# Altium footprint library STM32H7-Board.PcbLib: 36 footprints (part 1 of 3)
Each footprint in its own frame and in the unit in brackets; x right, y up, seen from the top. Pads: shape width x height; smd on the part's side, far side on the other; paste and mask are expansions set on the pad; w line width, h text height; cw(c..) or ccw(c..) is an arc to the next point about the centre after c.
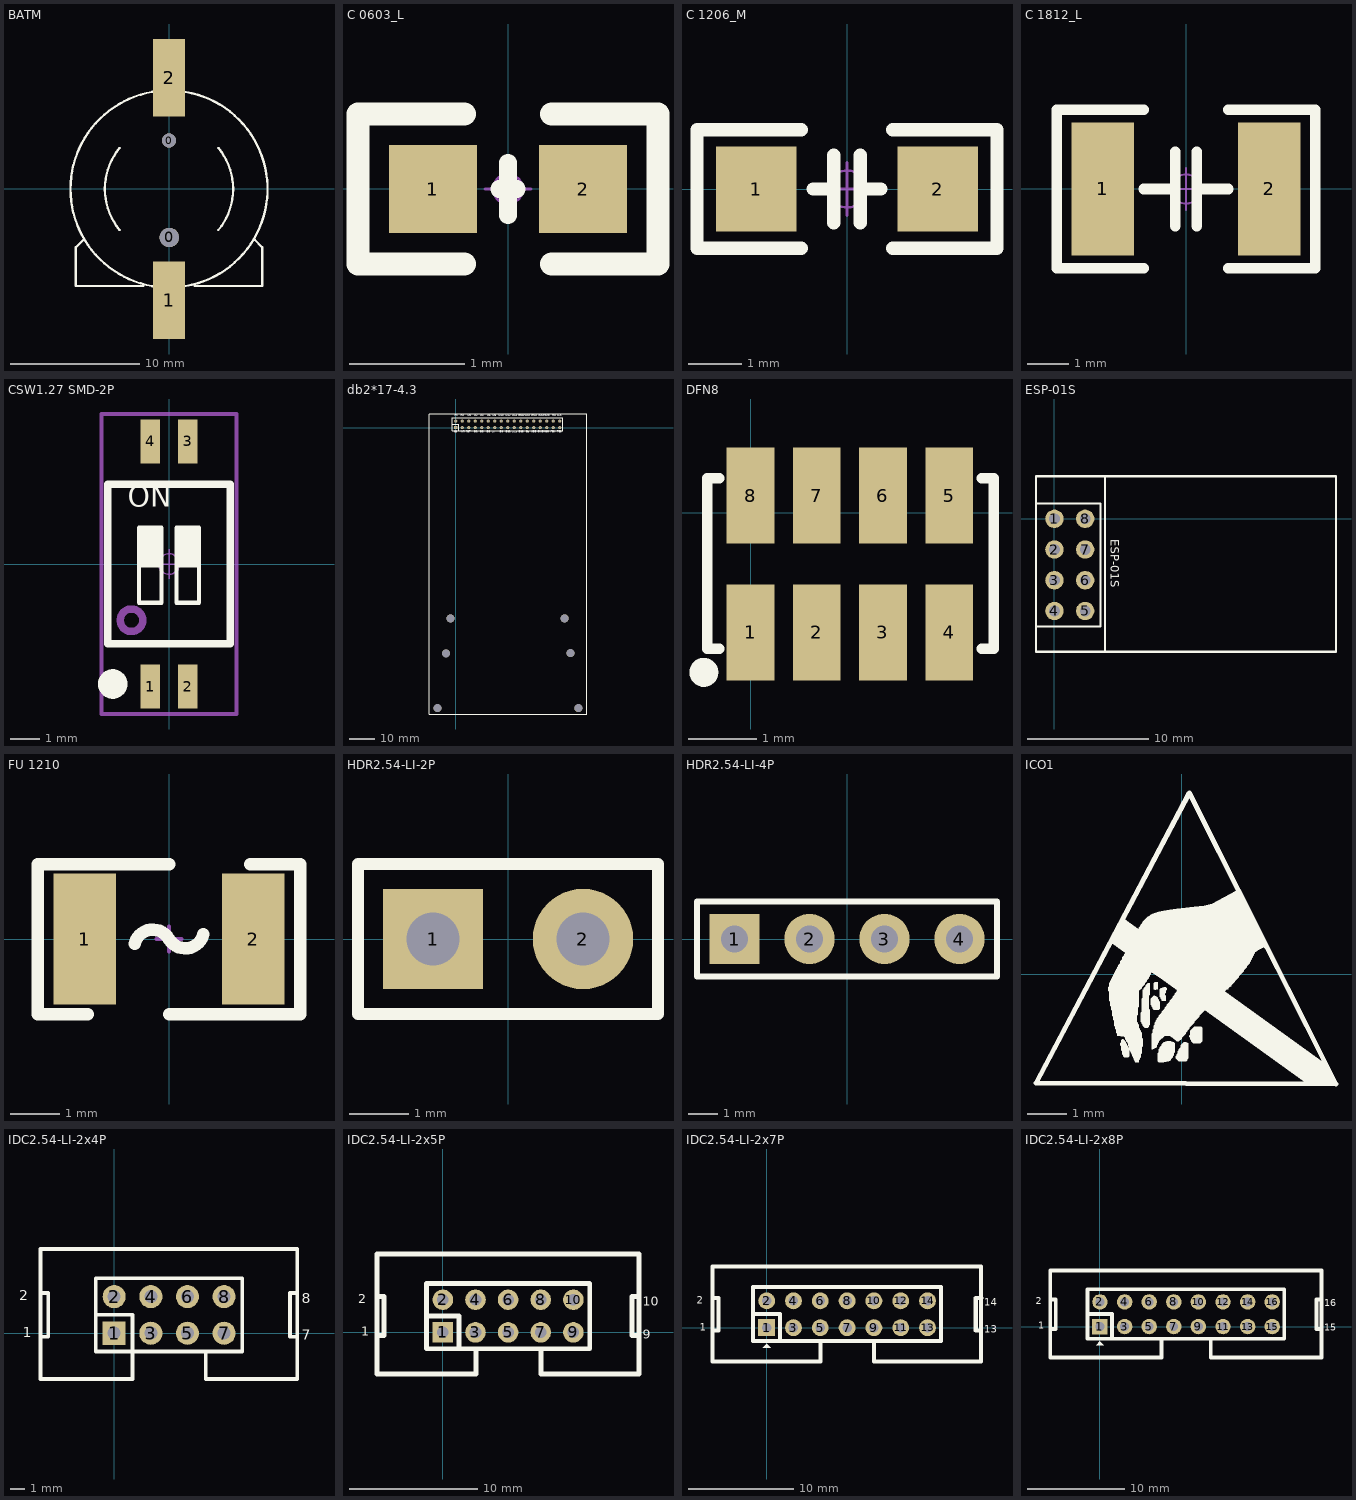
[diagram p0: the footprints below, top view; thin cyan lines are the x and y axes]

## BATM [mm]
height 10.16
pads (4):
  round 1.1 hole 1.1 unplated: 0(0,3.748)
  round 1.5 hole 1.5 unplated: 0(0.025,-3.752)
  rect 2.5x6 smd: 1(0,-8.602) 2(0,8.598)
Top Overlay:
  lines w0.178: -6.6,-3.902 -7.2,-4.502 -7.2,-7.502 -2,-7.502 ; -3.815,-3.171 cw(c0,-0.002) -3.812,3.171 ; -0.833,-7.576 cw(c0,-0.002) -7.62,-0.002 cw(c0,-0.002) -0.833,7.573 ; 0.833,-7.576 ccw(c0,-0.002) 0.833,7.573 ; 2,-7.502 7.2,-7.502 7.2,-4.502 6.625,-3.927 ; 3.81,-3.177 ccw(c0,-0.002) 3.812,3.171

## C 0603_L [mil] "无极性贴片电容"
height 400
pads (2):
  rect 30x30 smd: 1(-25.59,0) 2(25.59,0)
Top Overlay:
  lines w6: -3,0 0,0 3,0 ; 0,-9 0,9
  lines w8: -15,-25.59 -51.18,-25.59 -51.18,25.59 -15,25.59 ; 15,-25.59 51.18,-25.59 51.18,25.59 15,25.59
Mechanical 15:
  circle w1: c0,0 r5
  lines w1: -7.87,0 7.87,0 ; 0,-7.87 0,7.87
3D body "C 0603.STEP": height 31.89, standoff -0.39, extent -31.5,-16.14 31.5,16.14

## C 1206_M [mil] "无极性贴片电容"
height 400
pads (2):
  rect 60x62.99 smd: 1(-67.5,0) 2(67.5,0)
Top Overlay:
  lines w10: -34,-44 -111.5,-44 -111.5,44 -34,44 ; -25,0 -10,0 ; -10,-25 -10,25 ; 10,-25 10,25 ; 10,0 25,0 ; 34,-44 111.5,-44 111.5,44 34,44
Mechanical 15:
  circle w1.97: c0,0 r13.78
  lines w1.97: -19.68,0 19.68,0 ; 0,-19.68 0,19.68
3D body "C 1206.STEP": height 47.64, standoff -0.39, extent -62.99,-31.89 62.99,31.89

## C 1812_L [mm] "无极性贴片电容"
height 10.16
pads (2):
  rect 1.5x3.2 smd: 1(-2,0) 2(2,0)
Top Overlay:
  lines w0.254: -1.016,-1.905 -3.1,-1.905 -3.1,1.905 -1.016,1.905 ; -1.016,0 -0.254,0 ; -0.254,-0.889 -0.254,0.889 ; 0.254,-0.889 0.254,0.889 ; 0.254,0 1.016,0 ; 1.016,-1.905 3.1,-1.905 3.1,1.905 1.016,1.905
Mechanical 15:
  circle w0.05: c0,0 r0.35
  lines w0.05: -0.5,0 0.5,0 ; 0,-0.5 0,0.5
3D body "C 1812.STEP": height 2.01, standoff -0.01, extent -2.3,-1.61 2.3,1.61

## CSW1.27 SMD-2P [mm] "长：4.14mm，宽：5.4mm，高：2.3mm"
height 10.16
pads (4):
  rect 0.65x1.5 smd: 1(-0.635,-4.15) 2(0.635,-4.15) 3(0.635,4.15) 4(-0.635,4.15)
Top Overlay:
  circle w0.5: c-1.905,-4.064 r0.25
  region: 1.016,1.225 0.254,1.225 0.254,-0.045 1.016,-0.045
  region: -0.254,1.225 -1.016,1.225 -1.016,-0.045 -0.254,-0.045
  lines w0.15: -1.016,-0.045 -0.254,-0.045 ; 0.254,-0.045 1.016,-0.045 ; -1.016,-1.315 -1.016,1.225 -0.254,1.225 -0.254,-1.315 -1.016,-1.315 ; 0.254,-1.315 0.254,1.225 1.016,1.225 1.016,-1.315 0.254,-1.315
  lines w0.254: -2.07,-2.7 2.07,-2.7 2.07,2.7 -2.07,2.7 -2.07,-2.7
  text "ON" at -1.397,1.696 h1.2
Mechanical 13:
  circle w0.254: c-1.27,-1.905 r0.381
  lines w0.15: -2.032,-2.7 -2.032,2.7 2.032,2.7 2.032,-2.7 -2.032,-2.7
Mechanical 15:
  circle w0.05: c0,0 r0.35
  lines w0.05: -0.5,0 0.5,0 ; 0,-0.5 0,0.5
  lines w0.15: -2.286,-5.08 -2.286,5.08 2.286,5.08 2.286,-5.08 2.159,-5.08 -2.286,-5.08
3D body "CSW1.27-SMD-2P.STEP": height 2.35, standoff 0, extent -2.07,-4.35 2.07,4.35

## db2*17-4.3 [mm]
height 10.16
pads (40):
  rect 1.2x1.2 hole 0.7: 1(-0.002,0.006)
  round 1.2 hole 0.7: 2(-0.002,2.546) 3(2.538,0.006) 4(2.538,2.546) 5(5.08,0) 6(5.078,2.546) 7(7.62,0) 8(7.62,2.54) 9(10.158,0.006) 10(10.158,2.546) 11(12.698,0.006) 12(12.698,2.546) 13(15.238,0.006) 14(15.238,2.546) 15(17.778,0.006) 16(17.778,2.546) 17(20.318,0.006) 18(20.318,2.546) 19(22.858,0.006) 20(22.858,2.546) 21(25.398,0.006) 22(25.398,2.546) 23(27.938,0.006) 24(27.938,2.546) 25(30.478,0.006) 26(30.478,2.546) 27(33.018,0.006) 28(33.018,2.546) 29(35.558,0.006) 30(35.558,2.546) 31(38.098,0.006) 32(38.098,2.546) 33(40.638,0.006) 34(40.638,2.546)
  round 3.1 hole 3.1: ""(-7.125,-109.596) ""(-3.81,-88.18) ""(-2.037,-74.525) ""(42.54,-74.525) ""(44.82,-88.12) ""(47.925,-109.596)
Top Overlay:
  lines w0.2: -10.403,-111.887 -10.403,5.311 ; 51.245,-111.834 51.245,5.334
  lines w0.203: -10.403,-111.887 51.192,-111.887 ; -10.38,5.334 51.245,5.334 ; -1.27,1.27 1.27,1.27 1.27,-1.23 1.32,-1.28 -1.26,-1.28 -1.27,-1.27 -1.27,3.82 41.91,3.82 41.91,-1.26 ; 1.21,-1.28 41.91,-1.28 ; 41.91,-1.25 41.91,-0.95
  text "D14" at 22.023,4.106 h1.2
  text "RS" at -0.477,4.106 h1.2
  text "CS" at -0.51,-2.28 h1.2
  text "WR" at 2.03,-2.28 h1.2
  text "RST" at 4.189,-2.28 h1.2
  text "D1" at 7.237,-2.28 h1.2
  text "D2" at 7.148,4.106 h1.2
  text "D3" at 9.65,-2.28 h1.2
  text "D4" at 9.648,4.106 h1.2
  text "D5" at 12.19,-2.28 h1.2
  text "D6" at 12.273,4.106 h1.2
  text "D8" at 14.398,4.106 h1.2
  text "D9" at 17.143,-2.28 h1.2
  text "D12" at 19.523,4.106 h1.2
  text "D15" at 24.636,-2.28 h1.2
  text "VDD" at 29.589,-2.28 h1.2
  text "VDD" at 32.148,4.106 h1.2
  text "GND" at 29.523,4.106 h1.2
  text "VDD" at 27.023,4.106 h1.2
  text "D10" at 16.898,4.106 h1.2
  text "D0" at 4.648,4.106 h1.2
  text "RD" at 2.023,4.106 h1.2
  text "GND" at 24.523,4.106 h1.2
  text "GND" at 32.002,-2.28 h1.2
  text "D11" at 19.556,-2.28 h1.2
  text "PEN" at 37.209,-2.28 h1.2
  text "CLK" at 39.648,4.106 h1.2
  text "MOSI" at 34.398,4.106 h1.2
  text "MO" at 37.648,4.106 h1.2
  text "TCS" at 39.749,-2.28 h1.2
  text "MISO" at 34.288,-2.28 h1.2
  text "BL" at 27.557,-2.28 h1.2
  text "D14" at 22.025,4.1 h1.2
  text "RS" at -0.475,4.1 h1.2
  text "CS" at -0.508,-2.286 h1.2
  text "WR" at 2.032,-2.286 h1.2
  text "RST" at 4.191,-2.286 h1.2
  text "D1" at 7.239,-2.286 h1.2
  text "D2" at 7.15,4.1 h1.2
  text "D3" at 9.652,-2.286 h1.2
  text "D4" at 9.65,4.1 h1.2
  text "D5" at 12.192,-2.286 h1.2
  text "D6" at 12.275,4.1 h1.2
  text "D8" at 14.4,4.1 h1.2
  text "D9" at 17.145,-2.286 h1.2
  text "D13" at 22.025,-2.296 h1.2
  text "D12" at 19.525,4.1 h1.2
  text "D15" at 24.638,-2.286 h1.2
  text "VDD" at 29.591,-2.286 h1.2
  text "VDD" at 32.15,4.1 h1.2
  text "GND" at 29.525,4.1 h1.2
  text "VDD" at 27.025,4.1 h1.2
  text "D10" at 16.9,4.1 h1.2
  text "D0" at 4.65,4.1 h1.2
  text "RD" at 2.025,4.1 h1.2
  text "GND" at 24.525,4.1 h1.2
  text "GND" at 32.004,-2.286 h1.2
  text "D11" at 19.558,-2.286 h1.2
  text "PEN" at 37.211,-2.286 h1.2
  text "CLK" at 39.65,4.1 h1.2
  text "MOSI" at 34.4,4.1 h1.2
  text "MO" at 37.65,4.1 h1.2
  text "TCS" at 39.751,-2.286 h1.2
  text "MISO" at 34.29,-2.286 h1.2
  text "BL" at 27.559,-2.286 h1.2
  text "D7" at 14.351,-2.286 h1.2

## DFN8 [mm]
pads (8):
  rect 0.7x1.4 smd: 1(0,-1.753) 2(0.97,-1.753) 3(1.94,-1.753) 4(2.91,-1.753) 5(2.91,0.253) 6(1.94,0.253) 7(0.97,0.253) 8(0,0.253)
Top Overlay:
  circle w0.224: c-0.684,-2.337 r0.1
  lines w0.152: -0.457,-1.992 -0.635,-1.992 -0.635,0.508 -0.457,0.508 ; 3.387,-1.992 3.565,-1.992 3.565,0.508 3.387,0.508

## ESP-01S [mil]
height 1968.5
pads (8):
  round 60 hole 34.65: 1(0,0) 2(0,-100) 3(0,-200) 4(0,-300) 5(100,-300) 6(100,-200) 7(100,-100) 8(100,0)
Top Overlay:
  lines w7.05: -60,-350 150,-350 150,50 135,50 -60,50 ; 165,-432.53 165,138.34 ; -60,-432.53 -60,138.33 916.38,138.34 916.38,-432.53 -60,-432.53
  text "ESP-01S" at 173,-67 h47.24
3D body "User Library-Wi07C.STEP": height 231.4, standoff -228.35, extent -60,-432.53 916.38,138.34

## FU 1210 [mil] "贴片保险丝"
height 400
pads (2):
  rect 50x105 smd: 1(-67.5,0) 2(67.5,0)
Top Overlay:
  lines w10: -90,60 0,60 ; -65,-60 -105,-60 -105,60 -65,60 ; -27.48,-3.62 cw(c-12.99,-7.5) 0,0 ccw(c12.99,7.5) 27.48,3.62 ; 0,-60 90,-60 ; 65,-60 105,-60 105,60 65,60
Mechanical 15:
  lines w3: -10,0 10,0 ; 0,-10 0,10
3D body "FU 01210.STEP": height 34.25, standoff 0, extent -62.99,-50.39 62.99,50.39

## HDR2.54-LI-2P [mm] "排针，2脚"
height 10.16
pads (2):
  rect 1.7x1.7 hole 0.9: 1(-1.27,0)
  round 1.7 hole 0.9: 2(1.27,0)
Top Overlay:
  lines w0.2: -2.54,-1.27 -2.54,1.27 2.54,1.27 2.54,-1.27 -2.54,-1.27
3D body "HDR2.54-1P.STEP": height 8.5, standoff -3, extent 0,-1.27 2.54,1.27
3D body "HDR2.54-1P.STEP": height 8.5, standoff -3, extent -2.54,-1.27 0,1.27

## HDR2.54-LI-4P [mm] "排针，4脚"
height 10.16
pads (4):
  rect 1.7x1.7 hole 0.9: 1(-3.81,0)
  round 1.7 hole 0.9: 2(-1.27,0) 3(1.27,0) 4(3.81,0)
Top Overlay:
  lines w0.2: -5.08,-1.27 -5.08,1.27 5.08,1.27 5.08,-1.27 -5.08,-1.27
3D body "HDR2.54-1P.STEP": height 8.5, standoff -3, extent -5.08,-1.27 -2.54,1.27
3D body "HDR2.54-1P.STEP": height 8.5, standoff -3, extent -2.54,-1.27 0,1.27
3D body "HDR2.54-1P.STEP": height 8.5, standoff -3, extent 0,-1.27 2.54,1.27
3D body "HDR2.54-1P.STEP": height 8.5, standoff -3, extent 2.54,-1.27 5.08,1.27

## ICO1 [mm]
height 10.16
Top Overlay:
  drawing of 14 lines, arcs and shapes, not listed

## IDC2.54-LI-2x4P [mm] "8P简易牛角座"
height 10.16
pads (8):
  rect 1.6x1.6 hole 0.9: 1(0,0)
  round 1.6 hole 0.9: 2(0,2.54) 3(2.54,0) 4(2.54,2.54) 5(5.08,0) 6(5.08,2.54) 7(7.62,0) 8(7.62,2.54)
Top Overlay:
  lines w0.254: -5.11,-0.254 -4.572,-0.254 -4.572,2.794 -5.08,2.794 ; -1.27,1.27 1.27,1.27 1.27,-1.27 1.27,-3.175 -5.11,-3.175 -5.11,5.842 12.7,5.842 12.7,-3.175 6.35,-3.175 6.35,-1.27 ; 12.573,2.794 12.192,2.794 12.192,-0.254 12.7,-0.254 ; -1.27,-1.27 8.89,-1.27 8.89,3.81 -1.27,3.81 -1.27,-1.27
  text "1" at -6.35,-0.508 h1.2
  text "2" at -6.604,2.032 h1.2
  text "8" at 13.005,1.829 h1.2
  text "7" at 13.005,-0.711 h1.2
Bottom Overlay:
  lines w0.6: -1.041,1.27 8.89,1.27 ; 1.27,-1.016 1.27,3.353 ; 3.81,-1.016 3.81,3.353 ; 6.35,-1.016 6.35,3.353
3D body "IDC2.54-8P.STEP": height 9.17, standoff -3, extent -5.08,-3.08 12.7,5.77

## IDC2.54-LI-2x5P [mm] "10P简易牛角座"
height 10.16
pads (10):
  rect 1.6x1.6 hole 0.9: 1(0,0)
  round 1.6 hole 0.9: 2(0,2.54) 3(2.54,0) 4(2.54,2.54) 5(5.08,0) 6(5.08,2.54) 7(7.62,0) 8(7.62,2.54) 9(10.16,0) 10(10.16,2.54)
Top Overlay:
  lines w0.381: -5.11,-0.254 -4.572,-0.254 -4.572,2.794 -5.08,2.794 ; -1.27,1.27 1.27,1.27 1.27,-1.27 ; 2.565,-1.27 2.565,-3.23 -5.11,-3.23 -5.11,6.096 15.265,6.096 15.265,-3.234 ; 7.645,-1.27 7.645,-3.23 15.27,-3.23 ; 15.24,-0.254 14.732,-0.254 14.732,2.794 15.27,2.794 ; -1.27,-1.27 11.43,-1.27 11.43,3.81 -1.27,3.81 -1.27,-1.27
  text "2" at -6.604,2.032 h1.2
  text "1" at -6.35,-0.508 h1.2
  text "10" at 15.545,1.829 h1.2
  text "9" at 15.545,-0.711 h1.2
Bottom Overlay:
  lines w0.6: -1.041,1.27 11,1.27 ; 1.27,-1.016 1.27,3.353 ; 3.81,-1.016 3.81,3.353 ; 6.35,-1.016 6.35,3.353 ; 8.89,-1.016 8.89,3.353
3D body "IDC2.54-10P.STEP": height 9.17, standoff -3, extent -5.08,-3.08 15.24,5.77

## IDC2.54-LI-2x7P [mm] "14P简易牛角座"
height 10.16
pads (14):
  rect 1.6x1.6 hole 0.9: 1(0,0)
  round 1.6 hole 0.9: 2(0,2.54) 3(2.54,0) 4(2.54,2.54) 5(5.08,0) 6(5.08,2.54) 7(7.62,0) 8(7.62,2.54) 9(10.16,0) 10(10.16,2.54) 11(12.7,0) 12(12.7,2.54) 13(15.24,0) 14(15.24,2.54)
Top Overlay:
  region: -0.381,-1.905 0.381,-1.905 0,-1.524
  lines w0.381: -5.11,-0.254 -4.572,-0.254 -4.572,2.794 -5.08,2.794 ; -1.295,1.295 1.245,1.295 1.245,-1.245 ; 5.08,-1.245 5.08,-3.205 -5.135,-3.205 -5.135,5.795 20.32,5.795 20.32,-3.205 10.16,-3.205 10.16,-1.245 ; 20.32,-0.254 19.812,-0.254 19.812,2.794 20.35,2.794 ; -1.295,-1.245 -1.295,3.835 16.51,3.835 16.51,-1.245 -1.295,-1.245
  text "2" at -6.604,2.032 h1.2
  text "1" at -6.35,-0.508 h1.2
  text "14" at 20.625,1.829 h1.2
  text "13" at 20.625,-0.711 h1.2
Bottom Overlay:
  lines w0.6: -1.041,1.27 16.51,1.27 ; 1.27,-0.813 1.27,3.556 ; 3.81,-0.813 3.81,3.556 ; 6.35,-0.813 6.35,3.556 ; 8.89,-0.813 8.89,3.556 ; 11.43,-0.813 11.43,3.556 ; 13.97,-0.813 13.97,3.556
3D body "IDC2.54-14P.STEP": height 9.17, standoff -3, extent -5.08,-3.08 20.32,5.77

## IDC2.54-LI-2x8P [mm] "16P简易牛角座"
height 10.16
pads (16):
  rect 1.6x1.6 hole 0.9: 1(0,0)
  round 1.6 hole 0.9: 2(0,2.54) 3(2.54,0) 4(2.54,2.54) 5(5.08,0) 6(5.08,2.54) 7(7.62,0) 8(7.62,2.54) 9(10.16,0) 10(10.16,2.54) 11(12.7,0) 12(12.7,2.54) 13(15.24,0) 14(15.24,2.54) 15(17.78,0) 16(17.78,2.54)
Top Overlay:
  region: -0.381,-1.905 0.381,-1.905 0,-1.524
  lines w0.381: -5.11,-0.254 -4.572,-0.254 -4.572,2.794 -5.08,2.794 ; -1.295,1.295 1.245,1.295 1.245,-1.245 ; 6.35,-1.245 6.35,-3.205 -5.135,-3.205 -5.135,5.795 22.865,5.795 22.865,-3.205 11.43,-3.205 11.43,-1.245 ; 22.86,-0.254 22.352,-0.254 22.352,2.794 22.89,2.794 ; -1.295,-1.245 -1.295,3.835 19.025,3.835 19.025,-1.245 -1.295,-1.245
  text "1" at -6.35,-0.508 h1.2
  text "2" at -6.604,2.032 h1.2
  text "15" at 23.165,-0.711 h1.2
  text "16" at 23.165,1.829 h1.2
Bottom Overlay:
  lines w0.6: -1.041,1.27 18.5,1.27 ; 1.27,-0.813 1.27,3.556 ; 3.81,-0.813 3.81,3.556 ; 6.35,-0.813 6.35,3.556 ; 8.89,-0.813 8.89,3.556 ; 11.43,-0.813 11.43,3.556 ; 13.97,-0.813 13.97,3.556 ; 16.51,-0.813 16.51,3.556
3D body "IDC2.54-16P.STEP": height 9.17, standoff -3, extent -5.08,-3.08 22.86,5.77